# Altium footprint library TranDangKhoa-LIB.PcbLib: 1435 footprints (part 47 of 90)
Each footprint in its own frame and in the unit in brackets; x right, y up, seen from the top. Pads: shape width x height; smd on the part's side, far side on the other; paste and mask are expansions set on the pad; w line width, h text height; cw(c..) or ccw(c..) is an arc to the next point about the centre after c.
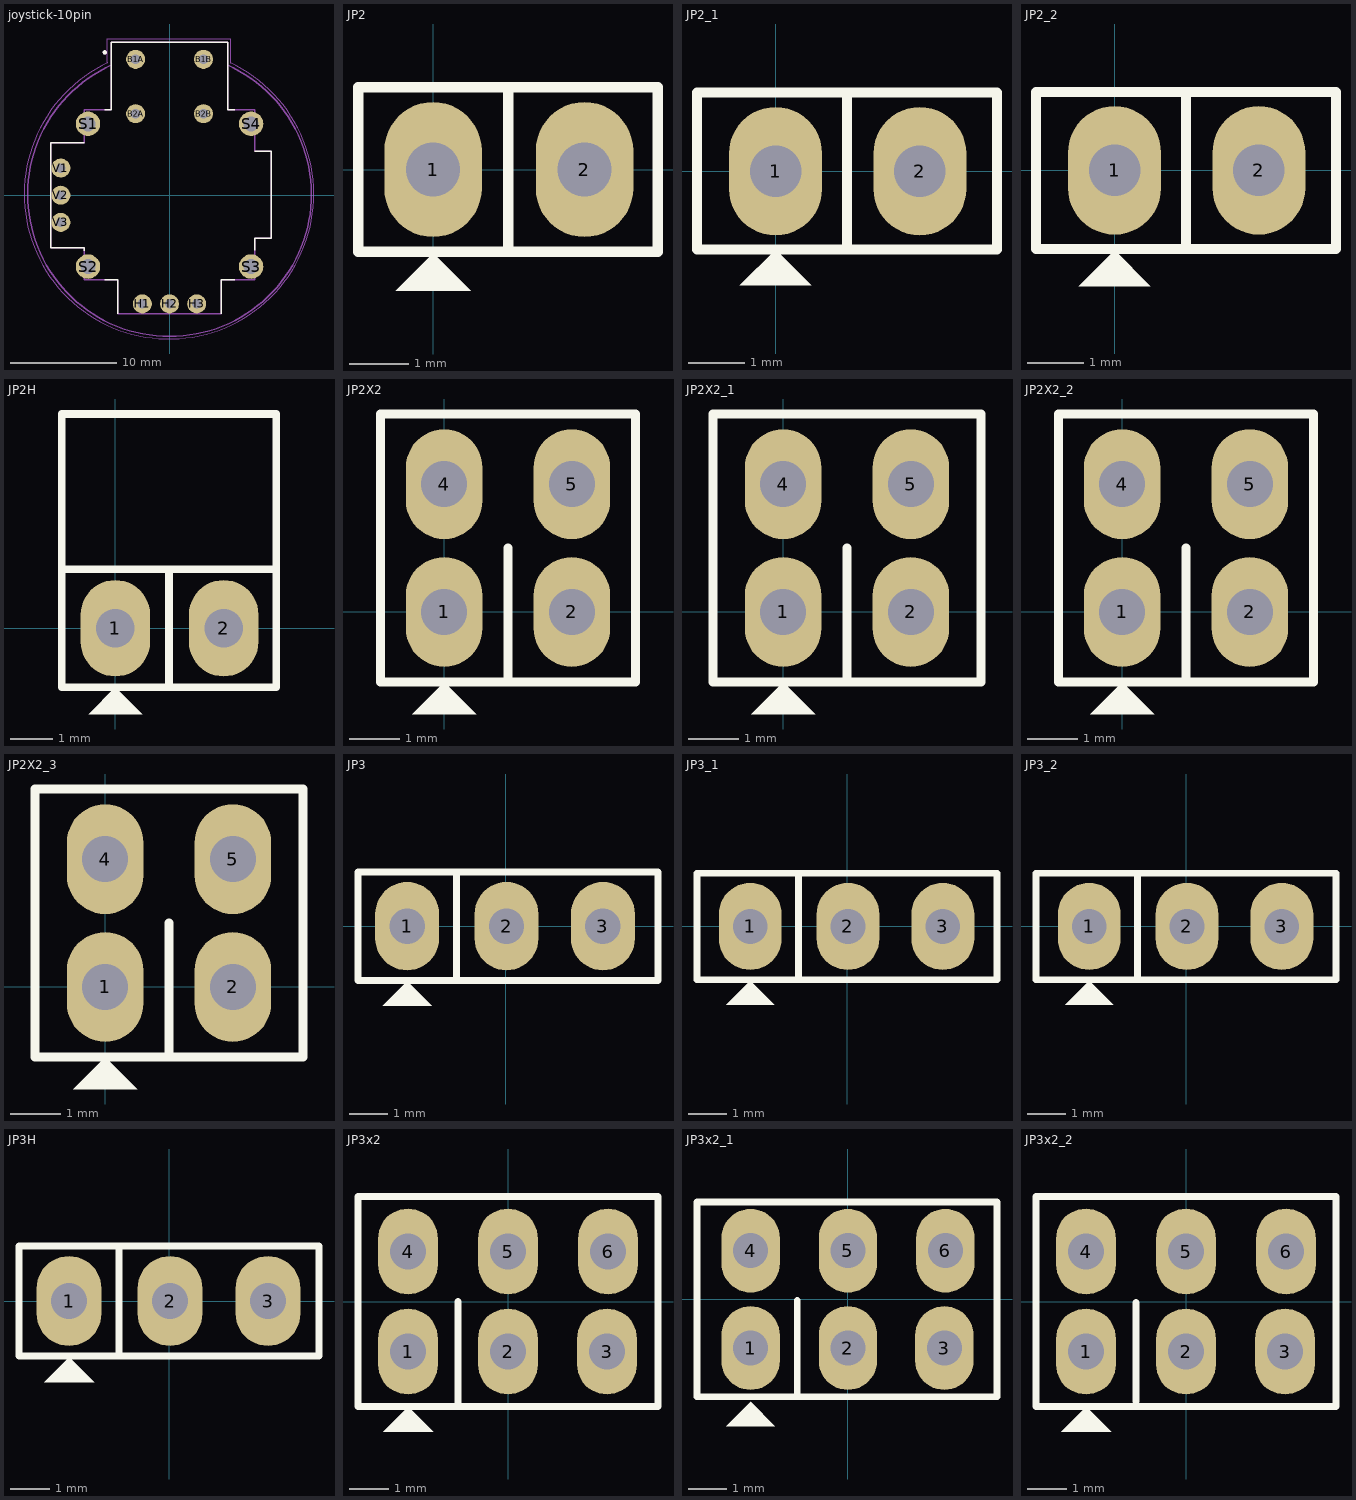
[diagram p46: the footprints below, top view; thin cyan lines are the x and y axes]

## joystick-10pin [mil] "joystick have button"
pads (14):
  round 70 hole 35.43: B1A(-125,500) B1B(125,500) B2A(-125,300) B2B(125,300)
  round 70 hole 35: H1(-100,-400) H2(0,-400) H3(100,-400) V1(-400,100) V2(-400,0) V3(-400,-100)
  round 90 hole 55: S1(-300,262.5) S2(-300,-262.5) S3(300,-262.5) S4(300,262.5)
Top Overlay:
  circle w7.87: c-238.19,525.59 r3.94
  lines w5: -312.99,-203.54 -312.99,-192.91 -437.01,-192.91 -437.01,192.91 -312.99,192.91 ; -238.98,-311.02 -190.94,-311.02 -190.94,-437.01 ; -238.98,314.96 -214.57,314.96 -214.57,562.99 214.57,562.99 214.57,314.96 239.37,314.96 ; 190.94,-437.01 190.94,-311.02 239.37,-311.02 ; 312.99,-201.57 312.99,-157.48 374.02,-157.48 374.02,161.42 312.99,161.42
Mechanical 13:
  circle w7.87: c-238.19,525.59 r3.94
  lines w5: -212.33,479.35 ccw(c0,2.45) 212.33,479.35 ; -437.01,-192.91 -312.99,-192.91 -312.99,-311.02 -190.94,-311.02 -190.94,-437.01 190.94,-437.01 190.94,-311.02 312.99,-311.02 312.99,-157.48 374.02,-157.48 374.02,161.42 312.99,161.42 312.99,314.96 214.57,314.96 214.57,562.99 -214.57,562.99 -214.57,314.96 -312.99,314.96 -312.99,192.91 -437.01,192.91 -437.01,-192.91
Mechanical 15:
  lines w1.97: -228.35,486.22 -228.35,574.8 224.41,574.8 224.41,486.22 ; -227.17,486.77 ccw(c-1.97,3.83) 223.23,486.77
3D body "COM-09032--3DModel-STEP-56544.STEP": height 1190, standoff -174.85, extent -525,-518.08 525,568.75

## JP2 [mil]
pads (2):
  oval 65x90 hole 36: 1(0,0) 2(101,0)
Top Overlay:
  region: 0,-56 -25,-81 25,-81
  lines w7: 50,-55 50,55 ; -50,-55 -50,55 150,55 150,-55 -50,-55
3D body "JP2.stp": height 354.33, standoff -86.61, extent -48.03,-50 148.03,48.43

## JP2_1 [mil]
pads (2):
  oval 65x90 hole 36: 1(0,0) 2(101,0)
Top Overlay:
  region: 0,-55 -25,-80 25,-80
  lines w7: 50,-55 50,55 ; -55,-55 -55,55 155,55 155,-55 -55,-55
3D body "female_header_a-bl254-eg-g02d.stp": height 366.14, standoff -94.49, extent -54.72,-48.22 155.12,50.2

## JP2_2 [mil]
pads (2):
  oval 65x90 hole 36: 1(0,0) 2(101,0)
Top Overlay:
  region: 0,-56 -25,-81 25,-81
  lines w7: 50,-55 50,55 ; -55,-55 -55,55 155,55 155,-55 -55,-55
3D body "female_header_a-bl254-ea-g02d.stp": height 108.27, standoff -116.14, extent -54.72,-8.26 155.12,387.8

## JP2H [mil]
pads (2):
  oval 65x90 hole 36: 1(0,0) 2(101,0)
Top Overlay:
  region: 0,-55 -25,-80 25,-80
  lines w7: -50,-55 150,-55
  lines w7.01: -50,-55 -50,200 150,200 150,-55 ; -50,55 150,55 ; 50,-55 50,55
3D body "JP2H.stp": height 108.27, standoff -84.65, extent -45.87,-12.6 146.26,425.99

## JP2X2 [mil]
pads (4):
  oval 60x86 hole 36: 1(0,0) 2(100,0) 4(0,100) 5(100,100)
Top Overlay:
  region: 0,-55 -25,-80 25,-80
  lines w7: 50,-55 50,50 ; -50,-55 150,-55 150,155 -50,155 -50,-55
3D body "JP2X2.stp": height 366.14, standoff -86.61, extent -49.99,-49.99 150.01,150.01

## JP2X2_1 [mil]
pads (4):
  oval 60x86 hole 36: 1(0,0) 2(100,0) 4(0,100) 5(100,100)
Top Overlay:
  region: 0,-55 -25,-80 25,-80
  lines w7: 50,-55 50,50 ; -55,-55 -55,155 155,155 155,-55 -55,-55
3D body "female_header_a-bl254-dg-g04d.stp": height 366.14, standoff -94.49, extent -55.12,-47.24 154.73,149.61

## JP2X2_2 [mil]
pads (4):
  oval 60x86 hole 36: 1(0,0) 2(100,0) 4(0,100) 5(100,100)
Top Overlay:
  region: 0,-55 -25,-80 25,-80
  lines w7: 50,-55 50,50 ; -50,-55 -50,50 -50,155 150,155 150,-55 -50,-55
3D body "pin_header_awl254-da-g04d.stp": height 216.54, standoff -98.43, extent -49.8,-12.01 150.2,495.08

## JP2X2_3 [mil]
pads (4):
  oval 60x86 hole 36: 1(0,0) 2(100,0) 4(0,100) 5(100,100)
Top Overlay:
  region: 0,-55 -25,-80 25,-80
  lines w7: 50,-55 50,50 ; -55,-55 155,-55 155,155 -55,155 -55,-55
3D body "female_header_a-bl254-da-g04d.stp": height 216.54, standoff -106.3, extent -55.12,-6.89 154.73,489.17

## JP3 [mil] "Jumper 3"
height 200
pads (3):
  oval 65x90 hole 36: 1(-100,0) 2(1,0) 3(99,0)
Top Overlay:
  region: -100,-56 -125,-81 -75,-81
  lines w7: -50,-55 -50,55 ; -150,-55 -150,55 155,55 155,-55 -150,-55
3D body "pin_header_aw140-eg-g03d.stp": height 354.33, standoff -86.61, extent -146.05,-49.04 153.94,49.32

## JP3_1 [mil] "Jumper 3"
height 200
pads (3):
  oval 65x90 hole 36: 1(-100,0) 2(1,0) 3(99,0)
Top Overlay:
  region: -100,-56 -125,-81 -75,-81
  lines w7: -50,-55 -50,55 ; -155,-55 155,-55 155,55 -155,55 -155,-55
3D body "female_header_a-bl254-eg-g03d.stp": height 366.14, standoff -94.49, extent -154.92,-46.26 154.92,52.17

## JP3_2 [mil] "Jumper 3"
height 200
pads (3):
  oval 65x90 hole 36: 1(-100,0) 2(1,0) 3(99,0)
Top Overlay:
  region: -100,-56 -125,-81 -75,-81
  lines w7: -50,-55 -50,55 ; -155,-55 155,-55 155,55 -155,55 -155,-55
3D body "female_header_a-bl254-ea-g03d.stp": height 108.27, standoff -116.14, extent -154.53,-5.9 155.32,390.16

## JP3H [mil] "Jumper 3"
height 200
pads (3):
  oval 65x90 hole 36: 1(-100,0) 2(1,0) 3(99,0)
Top Overlay:
  region: -100,-56 -125,-81 -75,-81
  lines w7: -50,-55 -50,55 ; -150,-55 -150,55 150,55 150,-55 -150,-55
3D body "pin_header_aw140-ea-g03g.stp": height 108.27, standoff -84.65, extent -145.67,-11.81 146.46,426.77

## JP3x2 [mil] "Connector 3x2"
height 200
pads (6):
  oval 60x86 hole 36: 1(-100,-50) 2(0,-50) 3(99,-50) 4(-100,50) 5(0,50) 6(100,50)
Top Overlay:
  region: -100,-105 -125,-130 -75,-130
  lines w7: -50,-105 -50,0 ; -150,-105 -150,0 -150,105 150,105 150,-105 -150,-105
3D body "JP2-3.stp": height 366.14, standoff -86.61, extent -149.99,-99.99 150.01,100.01

## JP3x2_1 [mil] "Connector 3x2"
height 200
pads (6):
  oval 60x86 hole 36: 1(-100,-50) 2(0,-50) 3(99,-50) 4(-100,50) 5(0,50) 6(100,50)
Top Overlay:
  region: -100,-105 -125,-130 -75,-130
  lines w7: -52,-100 -52,-1 ; -155,-100 153,-100 153,100 -155,100 -155,5 -155,-100
3D body "female_header_a-bl254-dg-g06d.stp": height 366.14, standoff -94.49, extent -153.54,-98.43 156.3,98.43

## JP3x2_2 [mil] "Connector 3x2"
height 200
pads (6):
  oval 60x86 hole 36: 1(-100,-50) 2(0,-50) 3(99,-50) 4(-100,50) 5(0,50) 6(100,50)
Top Overlay:
  region: -100,-105 -125,-130 -75,-130
  lines w7: -50,-100 -50,-1 ; -150,-105 -150,0 -150,105 150,105 150,-105 -150,-105
3D body "pin_header_awl254-da-g06d.stp": height 216.54, standoff -98.43, extent -150.59,-62.6 149.41,444.49